# Altium footprint library ACTION_非标准杂项.pcblib: 82 footprints (part 6 of 6)
Each footprint in its own frame and in the unit in brackets; x right, y up, seen from the top. Pads: shape width x height; smd on the part's side, far side on the other; paste and mask are expansions set on the pad; w line width, h text height; cw(c..) or ccw(c..) is an arc to the next point about the centre after c.
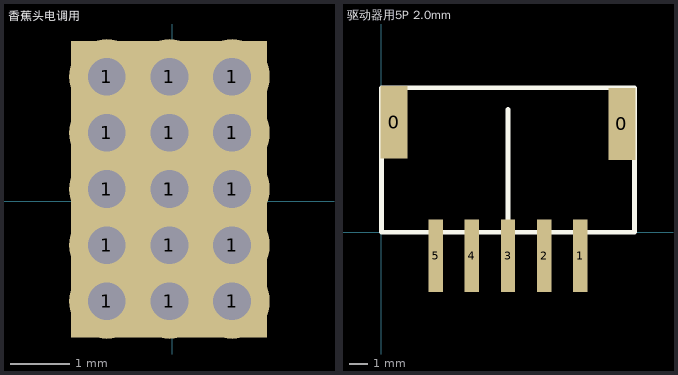
[diagram p5: the footprints below, top view; thin cyan lines are the x and y axes]

## 香蕉头电调用 [mm]
pads (16):
  round 1.27 hole 0.635: 1(-1.097,-1.684) 1(-1.097,-0.738) 1(-1.097,0.208) 1(-1.097,1.154) 1(-1.097,2.101) 1(-0.043,-1.684) 1(-0.043,-0.738) 1(-0.043,0.208) 1(-0.043,1.154) 1(-0.043,2.101) 1(1.011,-1.684) 1(1.011,-0.738) 1(1.011,0.208) 1(1.011,1.154) 1(1.011,2.101)
  rect 3.3x5 all layers, no hole: 1(-0.051,0.203)

## 驱动器用5P 2.0mm [mm]
pads (7):
  rect 1.5x4 all layers, no hole: 0(0.7,6.1) 0(13.3,6)
  rect 0.8x4 all layers, no hole: 1(11,-1.3) 2(9,-1.3) 3(7,-1.3) 4(5,-1.3) 5(3,-1.3)
Top Overlay:
  lines w0.254: 7,-1.3 7,6.8 ; 0,0 14,0 14,8 12.7,8 0,8 0,0